# Altium integrated library Altium_WR-TBL_Rising Cage Clamp (rev25a).IntLib: 435 symbols (part 3 of 3)
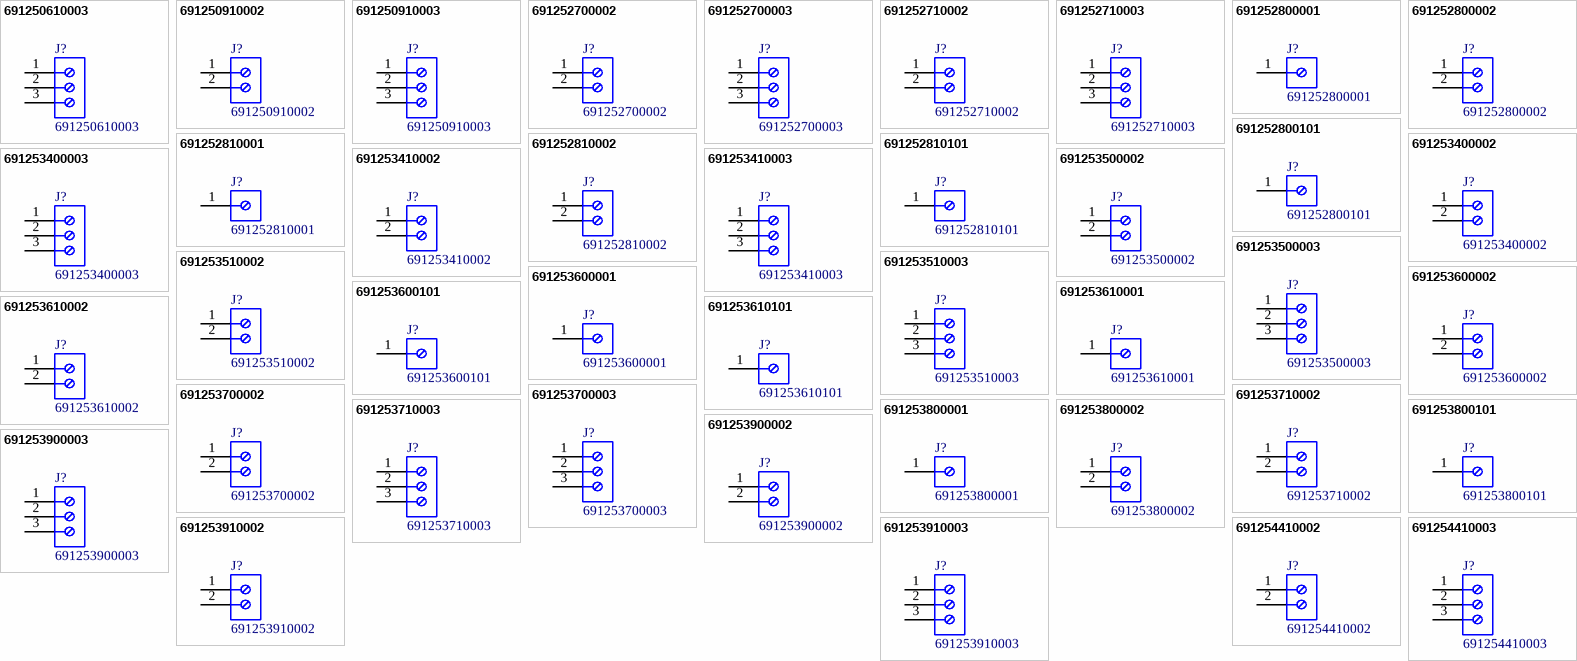
[diagram p12: symbols 691250610003 to 691254410003]

## 691253700002
designator J?
WR-TBL Series 2537 Vertical Entry Modular, THT, pitch 5mm, 02p; Manufacturer: Wurth Elektronik; Modularity: Yes; Rated Current: 16A; System: Rising Cage Clamp; Working Voltage: 300V; Manufacturer Part Number: 691253700002; Category: Terminal Block; Match Code: WR-TBL; ComponentLink1Description: Website Link; ComponentLink1URL: https://www.we-online.com/redexpert/article/691253700002?ad; ComponentLink2Description: Datasheet Link; ComponentLink2URL: https://www.we-online.com/redexpert/spec/691253700002?ad; Mount: Through Hole; Min Operating Temperature: -30°C; Max Operating Temperature: 120°C; Packaging: Box; Application: Rising Cage Clamp; Number of Pins: 2; Number of Rows: 1; Orientation: Vertical; Pitch: 5mm
footprint 691253700002
pins: 1, 2

## 691253700003
designator J?
WR-TBL Series 2537 Vertical Entry Modular, THT, pitch 5mm, 03p; Manufacturer: Wurth Elektronik; Modularity: Yes; Rated Current: 16A; System: Rising Cage Clamp; Working Voltage: 300V; Manufacturer Part Number: 691253700003; Category: Terminal Block; Match Code: WR-TBL; ComponentLink1Description: Website Link; ComponentLink1URL: https://www.we-online.com/redexpert/article/691253700003?ad; ComponentLink2Description: Datasheet Link; ComponentLink2URL: https://www.we-online.com/redexpert/spec/691253700003?ad; Mount: Through Hole; Min Operating Temperature: -30°C; Max Operating Temperature: 120°C; Packaging: Box; Application: Rising Cage Clamp; Number of Pins: 3; Number of Rows: 1; Orientation: Vertical; Pitch: 5mm
footprint 691253700003
pins: 1, 2, 3

## 691253710002
designator J?
WR-TBL Series 2537 Horizontal Entry Modular, THT, pitch 5mm, 02p; Manufacturer: Wurth Elektronik; Modularity: Yes; Rated Current: 16A; System: Rising Cage Clamp; Working Voltage: 300V; Manufacturer Part Number: 691253710002; Category: Terminal Block; Match Code: WR-TBL; ComponentLink1Description: Website Link; ComponentLink1URL: https://www.we-online.com/redexpert/article/691253710002?ad; ComponentLink2Description: Datasheet Link; ComponentLink2URL: https://www.we-online.com/redexpert/spec/691253710002?ad; Mount: Through Hole; Min Operating Temperature: -30°C; Max Operating Temperature: 120°C; Packaging: Box; Application: Rising Cage Clamp; Number of Pins: 2; Number of Rows: 1; Orientation: Horizontal; Pitch: 5mm
footprint 691253710002
pins: 1, 2

## 691253710003
designator J?
WR-TBL Series 2537 Horizontal Entry Modular, THT, pitch 5mm, 03p; Manufacturer: Wurth Elektronik; Modularity: Yes; Rated Current: 16A; System: Rising Cage Clamp; Working Voltage: 300V; Manufacturer Part Number: 691253710003; Category: Terminal Block; Match Code: WR-TBL; ComponentLink1Description: Website Link; ComponentLink1URL: https://www.we-online.com/redexpert/article/691253710003?ad; ComponentLink2Description: Datasheet Link; ComponentLink2URL: https://www.we-online.com/redexpert/spec/691253710003?ad; Mount: Through Hole; Min Operating Temperature: -30°C; Max Operating Temperature: 120°C; Packaging: Box; Application: Rising Cage Clamp; Number of Pins: 3; Number of Rows: 1; Orientation: Horizontal; Pitch: 5mm
footprint 691253710003
pins: 1, 2, 3

## 691253800001
designator J?
WR-TBL Series 2538 Vertical Entry Modular, THT, pitch 10mm, 01p; Manufacturer: Wurth Elektronik; Modularity: Yes; Rated Current: 16A; System: Rising Cage Clamp; Working Voltage: 300V; Manufacturer Part Number: 691253800001; Category: Terminal Block; Match Code: WR-TBL; ComponentLink1Description: Website Link; ComponentLink1URL: https://www.we-online.com/redexpert/article/691253800001?ad; ComponentLink2Description: Datasheet Link; ComponentLink2URL: https://www.we-online.com/redexpert/spec/691253800001?ad; Mount: Through Hole; Min Operating Temperature: -30°C; Max Operating Temperature: 120°C; Packaging: Box; Application: Rising Cage Clamp; Number of Pins: 1; Number of Rows: 1; Orientation: Vertical; Pitch: 10mm
footprint 691253800001
pins: 1

## 691253800002
designator J?
WR-TBL Series 2538 Vertical Entry Modular, THT, pitch 10mm, 02p; Manufacturer: Wurth Elektronik; Modularity: Yes; Rated Current: 16A; System: Rising Cage Clamp; Working Voltage: 300V; Manufacturer Part Number: 691253800002; Category: Terminal Block; Match Code: WR-TBL; ComponentLink1Description: Website Link; ComponentLink1URL: https://www.we-online.com/redexpert/article/691253800002?ad; ComponentLink2Description: Datasheet Link; ComponentLink2URL: https://www.we-online.com/redexpert/spec/691253800002?ad; Mount: Through Hole; Min Operating Temperature: -30°C; Max Operating Temperature: 120°C; Packaging: Box; Application: Rising Cage Clamp; Number of Pins: 2; Number of Rows: 1; Orientation: Vertical; Pitch: 10mm
footprint 691253800002
pins: 1, 2

## 691253800101
designator J?
WR-TBL Series 2538 Vertical Entry Modular, THT, pitch 10mm, 01p; Manufacturer: Wurth Elektronik; Modularity: Yes; Rated Current: 16A; System: Rising Cage Clamp; Working Voltage: 300V; Manufacturer Part Number: 691253800101; Category: Terminal Block; Match Code: WR-TBL; ComponentLink1Description: Website Link; ComponentLink1URL: https://www.we-online.com/redexpert/article/691253800101?ad; ComponentLink2Description: Datasheet Link; ComponentLink2URL: https://www.we-online.com/redexpert/spec/691253800101?ad; Mount: Through Hole; Min Operating Temperature: -30°C; Max Operating Temperature: 120°C; Packaging: Box; Application: Rising Cage Clamp; Number of Pins: 1; Number of Rows: 1; Orientation: Vertical; Pitch: 10mm
footprint 691253800101
pins: 1

## 691253900002
designator J?
WR-TBL Series 2539 Vertical Entry Modular, THT, pitch 7.5mm, 02p; Manufacturer: Wurth Elektronik; Modularity: Yes; Rated Current: 16A; System: Rising Cage Clamp; Working Voltage: 300V; Manufacturer Part Number: 691253900002; Category: Terminal Block; Match Code: WR-TBL; ComponentLink1Description: Website Link; ComponentLink1URL: https://www.we-online.com/redexpert/article/691253900002?ad; ComponentLink2Description: Datasheet Link; ComponentLink2URL: https://www.we-online.com/redexpert/spec/691253900002?ad; Mount: Through Hole; Min Operating Temperature: -30°C; Max Operating Temperature: 120°C; Packaging: Box; Application: Rising Cage Clamp; Number of Pins: 2; Number of Rows: 1; Orientation: Vertical; Pitch: 7.5mm
footprint 691253900002
pins: 1, 2

## 691253900003
designator J?
WR-TBL Series 2539 Vertical Entry Modular, THT, pitch 7.5mm, 03p; Manufacturer: Wurth Elektronik; Modularity: Yes; Rated Current: 16A; System: Rising Cage Clamp; Working Voltage: 300V; Manufacturer Part Number: 691253900003; Category: Terminal Block; Match Code: WR-TBL; ComponentLink1Description: Website Link; ComponentLink1URL: https://www.we-online.com/redexpert/article/691253900003?ad; ComponentLink2Description: Datasheet Link; ComponentLink2URL: https://www.we-online.com/redexpert/spec/691253900003?ad; Mount: Through Hole; Min Operating Temperature: -30°C; Max Operating Temperature: 120°C; Packaging: Box; Application: Rising Cage Clamp; Number of Pins: 3; Number of Rows: 1; Orientation: Vertical; Pitch: 7.5mm
footprint 691253900003
pins: 1, 2, 3

## 691253910002
designator J?
WR-TBL Series 2539 Horizontal Entry Modular, THT, pitch 7.5mm, 02p; Manufacturer: Wurth Elektronik; Modularity: Yes; Rated Current: 16A; System: Rising Cage Clamp; Working Voltage: 300V; Manufacturer Part Number: 691253910002; Category: Terminal Block; Match Code: WR-TBL; ComponentLink1Description: Website Link; ComponentLink1URL: https://www.we-online.com/redexpert/article/691253910002?ad; ComponentLink2Description: Datasheet Link; ComponentLink2URL: https://www.we-online.com/redexpert/spec/691253910002?ad; Mount: Through Hole; Min Operating Temperature: -30°C; Max Operating Temperature: 120°C; Packaging: Box; Application: Rising Cage Clamp; Number of Pins: 2; Number of Rows: 1; Orientation: Horizontal; Pitch: 7.5mm
footprint 691253910002
pins: 1, 2

## 691253910003
designator J?
WR-TBL Series 2539 Horizontal Entry Modular, THT, pitch 7.5mm, 03p; Manufacturer: Wurth Elektronik; Modularity: Yes; Rated Current: 16A; System: Rising Cage Clamp; Working Voltage: 300V; Manufacturer Part Number: 691253910003; Category: Terminal Block; Match Code: WR-TBL; ComponentLink1Description: Website Link; ComponentLink1URL: https://www.we-online.com/redexpert/article/691253910003?ad; ComponentLink2Description: Datasheet Link; ComponentLink2URL: https://www.we-online.com/redexpert/spec/691253910003?ad; Mount: Through Hole; Min Operating Temperature: -30°C; Max Operating Temperature: 120°C; Packaging: Box; Application: Rising Cage Clamp; Number of Pins: 3; Number of Rows: 1; Orientation: Horizontal; Pitch: 7.5mm
footprint 691253910003
pins: 1, 2, 3

## 691254410002
designator J?
WR-TBL Series 2544 Horizontal Entry Dual Pin, THT, pitch 7.62mm, 02p; Manufacturer: Wurth Elektronik; Modularity: Yes; Rated Current: 16A; System: Rising Cage Clamp; Working Voltage: 300V; Manufacturer Part Number: 691254410002; Category: Terminal Block; Match Code: WR-TBL; ComponentLink1Description: Website Link; ComponentLink1URL: https://www.we-online.com/redexpert/article/691254410002?ad; ComponentLink2Description: Datasheet Link; ComponentLink2URL: https://www.we-online.com/redexpert/spec/691254410002?ad; Mount: Through Hole; Min Operating Temperature: -30°C; Max Operating Temperature: 120°C; Packaging: Box; Application: Rising Cage Clamp; Number of Pins: 2; Number of Rows: 1; Orientation: Horizontal; Pitch: 7.62mm
footprint 691254410002
pins: 1, 2

## 691254410003
designator J?
WR-TBL Series 2544 Horizontal Entry Dual Pin, THT, pitch 7.62mm, 03p; Manufacturer: Wurth Elektronik; Modularity: Yes; Rated Current: 16A; System: Rising Cage Clamp; Working Voltage: 300V; Manufacturer Part Number: 691254410003; Category: Terminal Block; Match Code: WR-TBL; ComponentLink1Description: Website Link; ComponentLink1URL: https://www.we-online.com/redexpert/article/691254410003?ad; ComponentLink2Description: Datasheet Link; ComponentLink2URL: https://www.we-online.com/redexpert/spec/691254410003?ad; Mount: Through Hole; Min Operating Temperature: -30°C; Max Operating Temperature: 120°C; Packaging: Box; Application: Rising Cage Clamp; Number of Pins: 3; Number of Rows: 1; Orientation: Horizontal; Pitch: 7.62mm
footprint 691254410003
pins: 1, 2, 3

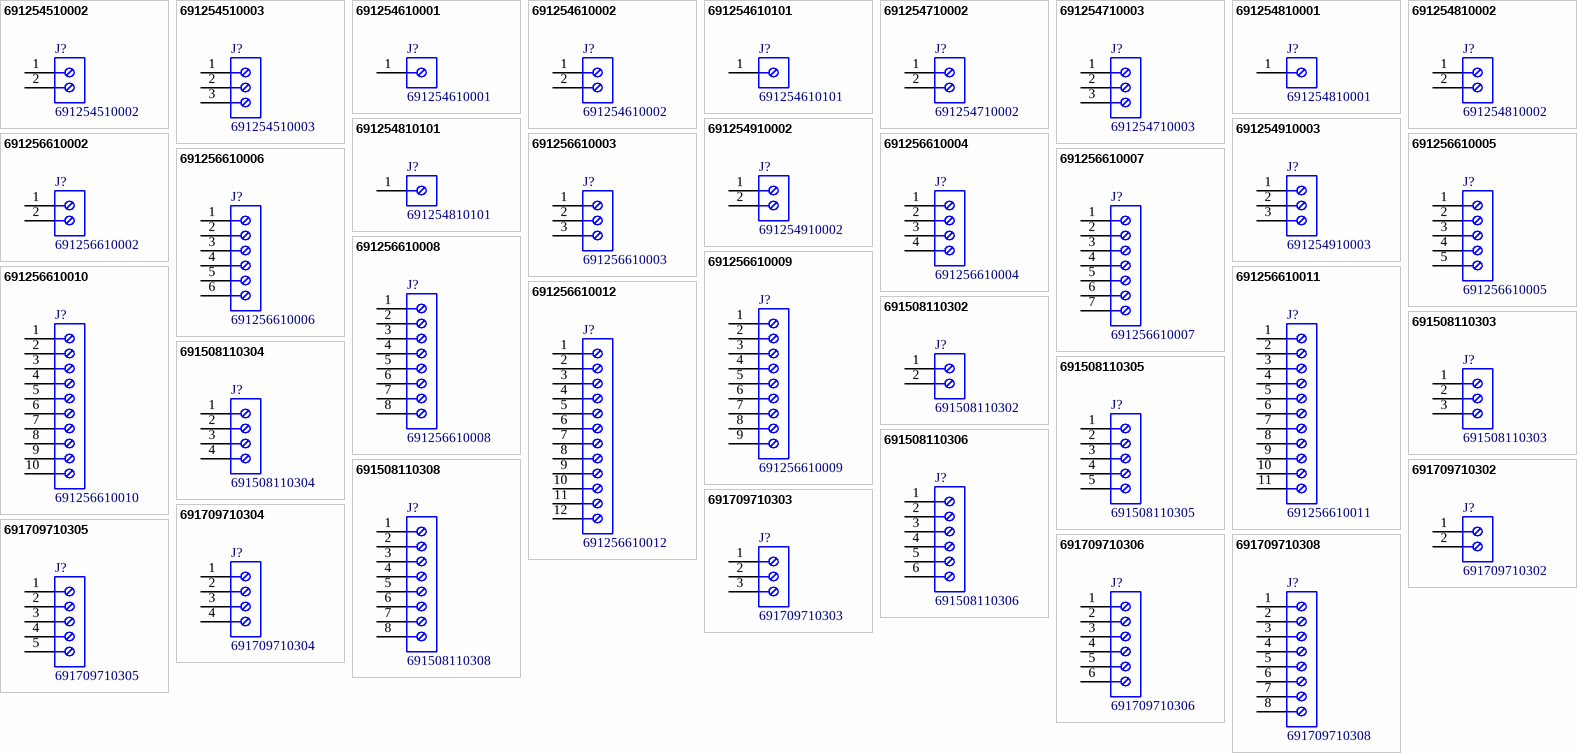
[diagram p10: symbols 691254510002 to 691709710308]

## 691254510002
designator J?
WR-TBL Series 2545 Horizontal Cable Entry, THT, pitch 5.08mm, 02p; Manufacturer: Wurth Elektronik; Modularity: Yes; Rated Current: 16A; System: Rising Cage Clamp; Working Voltage: 300V; Manufacturer Part Number: 691254510002; Category: Terminal Block; Match Code: WR-TBL; ComponentLink1Description: Website Link; ComponentLink1URL: https://www.we-online.com/redexpert/article/691254510002?ad; ComponentLink2Description: Datasheet Link; ComponentLink2URL: https://www.we-online.com/redexpert/spec/691254510002?ad; Mount: Through Hole; Min Operating Temperature: -30°C; Max Operating Temperature: 120°C; Packaging: Box; Application: Rising Cage Clamp; Number of Pins: 2; Number of Rows: 1; Orientation: Horizontal; Pitch: 5.08mm
footprint 691254510002
pins: 1, 2

## 691254510003
designator J?
WR-TBL Series 2545 Horizontal Cable Entry, THT, pitch 5.08mm, 03p; Manufacturer: Wurth Elektronik; Modularity: Yes; Rated Current: 16A; System: Rising Cage Clamp; Working Voltage: 300V; Manufacturer Part Number: 691254510003; Category: Terminal Block; Match Code: WR-TBL; ComponentLink1Description: Website Link; ComponentLink1URL: https://www.we-online.com/redexpert/article/691254510003?ad; ComponentLink2Description: Datasheet Link; ComponentLink2URL: https://www.we-online.com/redexpert/spec/691254510003?ad; Mount: Through Hole; Min Operating Temperature: -30°C; Max Operating Temperature: 120°C; Packaging: Box; Application: Rising Cage Clamp; Number of Pins: 3; Number of Rows: 1; Orientation: Horizontal; Pitch: 5.08mm
footprint 691254510003
pins: 1, 2, 3

## 691254610001
designator J?
WR-TBL Series 2546 Horizontal Cable Entry, THT, pitch 10.16mm, 01p; Manufacturer: Wurth Elektronik; Modularity: Yes; Rated Current: 16A; System: Rising Cage Clamp; Working Voltage: 300V; Manufacturer Part Number: 691254610001; Category: Terminal Block; Match Code: WR-TBL; ComponentLink1Description: Website Link; ComponentLink1URL: https://www.we-online.com/redexpert/article/691254610001?ad; ComponentLink2Description: Datasheet Link; ComponentLink2URL: https://www.we-online.com/redexpert/spec/691254610001?ad; Mount: Through Hole; Min Operating Temperature: -30°C; Max Operating Temperature: 120°C; Packaging: Box; Application: Rising Cage Clamp; Number of Pins: 1; Number of Rows: 1; Orientation: Horizontal; Pitch: 10.16mm
footprint 691254610001
pins: 1

## 691254610002
designator J?
WR-TBL Series 2546 Horizontal Cable Entry, THT, pitch 10.16mm, 02p; Manufacturer: Wurth Elektronik; Modularity: Yes; Rated Current: 16A; System: Rising Cage Clamp; Working Voltage: 300V; Manufacturer Part Number: 691254610002; Category: Terminal Block; Match Code: WR-TBL; ComponentLink1Description: Website Link; ComponentLink1URL: https://www.we-online.com/redexpert/article/691254610002?ad; ComponentLink2Description: Datasheet Link; ComponentLink2URL: https://www.we-online.com/redexpert/spec/691254610002?ad; Mount: Through Hole; Min Operating Temperature: -30°C; Max Operating Temperature: 120°C; Packaging: Box; Application: Rising Cage Clamp; Number of Pins: 2; Number of Rows: 1; Orientation: Horizontal; Pitch: 10.16mm
footprint 691254610002
pins: 1, 2

## 691254610101
designator J?
WR-TBL Series 2546 Horizontal Cable Entry, THT, pitch 10.16mm, 01p; Manufacturer: Wurth Elektronik; Modularity: Yes; Rated Current: 16A; System: Rising Cage Clamp; Working Voltage: 300V; Manufacturer Part Number: 691254610101; Category: Terminal Block; Match Code: WR-TBL; ComponentLink1Description: Website Link; ComponentLink1URL: https://www.we-online.com/redexpert/article/691254610101?ad; ComponentLink2Description: Datasheet Link; ComponentLink2URL: https://www.we-online.com/redexpert/spec/691254610101?ad; Mount: Through Hole; Min Operating Temperature: -30°C; Max Operating Temperature: 120°C; Packaging: Box; Application: Rising Cage Clamp; Number of Pins: 1; Number of Rows: 1; Orientation: Horizontal; Pitch: 10.16mm
footprint 691254610101
pins: 1

## 691254710002
designator J?
WR-TBL Series 2547 Horizontal Cable Entry, THT, pitch 5mm, 02p; Manufacturer: Wurth Elektronik; Modularity: Yes; Rated Current: 16A; System: Rising Cage Clamp; Working Voltage: 300V; Manufacturer Part Number: 691254710002; Category: Terminal Block; Match Code: WR-TBL; ComponentLink1Description: Website Link; ComponentLink1URL: https://www.we-online.com/redexpert/article/691254710002?ad; ComponentLink2Description: Datasheet Link; ComponentLink2URL: https://www.we-online.com/redexpert/spec/691254710002?ad; Mount: Through Hole; Min Operating Temperature: -30°C; Max Operating Temperature: 120°C; Packaging: Box; Application: Rising Cage Clamp; Number of Pins: 2; Number of Rows: 1; Orientation: Horizontal; Pitch: 5mm
footprint 691254710002
pins: 1, 2

## 691254710003
designator J?
WR-TBL Series 2547 Horizontal Cable Entry, THT, pitch 5mm, 03p; Manufacturer: Wurth Elektronik; Modularity: Yes; Rated Current: 16A; System: Rising Cage Clamp; Working Voltage: 300V; Manufacturer Part Number: 691254710003; Category: Terminal Block; Match Code: WR-TBL; ComponentLink1Description: Website Link; ComponentLink1URL: https://www.we-online.com/redexpert/article/691254710003?ad; ComponentLink2Description: Datasheet Link; ComponentLink2URL: https://www.we-online.com/redexpert/spec/691254710003?ad; Mount: Through Hole; Min Operating Temperature: -30°C; Max Operating Temperature: 120°C; Packaging: Box; Application: Rising Cage Clamp; Number of Pins: 3; Number of Rows: 1; Orientation: Horizontal; Pitch: 5mm
footprint 691254710003
pins: 1, 2, 3

## 691254810001
designator J?
WR-TBL Series 2548 Horizontal Cable Entry, THT, pitch 10mm, 01p; Manufacturer: Wurth Elektronik; Modularity: Yes; Rated Current: 16A; System: Rising Cage Clamp; Working Voltage: 300V; Manufacturer Part Number: 691254810001; Category: Terminal Block; Match Code: WR-TBL; ComponentLink1Description: Website Link; ComponentLink1URL: https://www.we-online.com/redexpert/article/691254810001?ad; ComponentLink2Description: Datasheet Link; ComponentLink2URL: https://www.we-online.com/redexpert/spec/691254810001?ad; Mount: Through Hole; Min Operating Temperature: -30°C; Max Operating Temperature: 120°C; Packaging: Box; Application: Rising Cage Clamp; Number of Pins: 1; Number of Rows: 1; Orientation: Horizontal; Pitch: 10mm
footprint 691254810001
pins: 1

## 691254810002
designator J?
WR-TBL Series 2548 Horizontal Cable Entry, THT, pitch 10mm, 02p; Manufacturer: Wurth Elektronik; Modularity: Yes; Rated Current: 16A; System: Rising Cage Clamp; Working Voltage: 300V; Manufacturer Part Number: 691254810002; Category: Terminal Block; Match Code: WR-TBL; ComponentLink1Description: Website Link; ComponentLink1URL: https://www.we-online.com/redexpert/article/691254810002?ad; ComponentLink2Description: Datasheet Link; ComponentLink2URL: https://www.we-online.com/redexpert/spec/691254810002?ad; Mount: Through Hole; Min Operating Temperature: -30°C; Max Operating Temperature: 120°C; Packaging: Box; Application: Rising Cage Clamp; Number of Pins: 2; Number of Rows: 1; Orientation: Horizontal; Pitch: 10mm
footprint 691254810002
pins: 1, 2

## 691254810101
designator J?
WR-TBL Series 2548 Horizontal Cable Entry, THT, pitch 10mm, 01p; Manufacturer: Wurth Elektronik; Modularity: Yes; Rated Current: 16A; System: Rising Cage Clamp; Working Voltage: 300V; Manufacturer Part Number: 691254810101; Category: Terminal Block; Match Code: WR-TBL; ComponentLink1Description: Website Link; ComponentLink1URL: https://www.we-online.com/redexpert/article/691254810101?ad; ComponentLink2Description: Datasheet Link; ComponentLink2URL: https://www.we-online.com/redexpert/spec/691254810101?ad; Mount: Through Hole; Min Operating Temperature: -30°C; Max Operating Temperature: 120°C; Packaging: Box; Application: Rising Cage Clamp; Number of Pins: 1; Number of Rows: 1; Orientation: Horizontal; Pitch: 10mm
footprint 691254810101
pins: 1

## 691254910002
designator J?
WR-TBL Series 2549 Horizontal Cable Entry, THT, pitch 7.5mm, 02p; Manufacturer: Wurth Elektronik; Modularity: Yes; Rated Current: 16A; System: Rising Cage Clamp; Working Voltage: 300V; Manufacturer Part Number: 691254910002; Category: Terminal Block; Match Code: WR-TBL; ComponentLink1Description: Website Link; ComponentLink1URL: https://www.we-online.com/redexpert/article/691254910002?ad; ComponentLink2Description: Datasheet Link; ComponentLink2URL: https://www.we-online.com/redexpert/spec/691254910002?ad; Mount: Through Hole; Min Operating Temperature: -30°C; Max Operating Temperature: 120°C; Packaging: Box; Application: Rising Cage Clamp; Number of Pins: 2; Number of Rows: 1; Orientation: Horizontal; Pitch: 7.5mm
footprint 691254910002
pins: 1, 2

## 691254910003
designator J?
WR-TBL Series 2549 Horizontal Cable Entry, THT, pitch 7.5mm, 03p; Manufacturer: Wurth Elektronik; Modularity: Yes; Rated Current: 16A; System: Rising Cage Clamp; Working Voltage: 300V; Manufacturer Part Number: 691254910003; Category: Terminal Block; Match Code: WR-TBL; ComponentLink1Description: Website Link; ComponentLink1URL: https://www.we-online.com/redexpert/article/691254910003?ad; ComponentLink2Description: Datasheet Link; ComponentLink2URL: https://www.we-online.com/redexpert/spec/691254910003?ad; Mount: Through Hole; Min Operating Temperature: -30°C; Max Operating Temperature: 120°C; Packaging: Box; Application: Rising Cage Clamp; Number of Pins: 3; Number of Rows: 1; Orientation: Horizontal; Pitch: 7.5mm
footprint 691254910003
pins: 1, 2, 3

## 691256610002
designator J?
WR-TBL Series 2566 Horizontal Entry, THT, pitch 10.16mm, 02p; Manufacturer: Wurth Elektronik; Modularity: No; Rated Current: 40A; System: Rising Cage Clamp; Working Voltage: 300V; Manufacturer Part Number: 691256610002; Category: Terminal Block; Match Code: WR-TBL; ComponentLink1Description: Website Link; ComponentLink1URL: https://www.we-online.com/redexpert/article/691256610002?ad; ComponentLink2Description: Datasheet Link; ComponentLink2URL: https://www.we-online.com/redexpert/spec/691256610002?ad; Mount: Through Hole; Min Operating Temperature: -30°C; Max Operating Temperature: 120°C; Packaging: Box; Application: Rising Cage Clamp; Number of Pins: 2; Number of Rows: 1; Orientation: Horizontal; Pitch: 10.16mm
footprint 691256610002
pins: 1, 2

## 691256610003
designator J?
WR-TBL Series 2566 Horizontal Entry, THT, pitch 10.16mm, 03p; Manufacturer: Wurth Elektronik; Modularity: No; Rated Current: 40A; System: Rising Cage Clamp; Working Voltage: 300V; Manufacturer Part Number: 691256610003; Category: Terminal Block; Match Code: WR-TBL; ComponentLink1Description: Website Link; ComponentLink1URL: https://www.we-online.com/redexpert/article/691256610003?ad; ComponentLink2Description: Datasheet Link; ComponentLink2URL: https://www.we-online.com/redexpert/spec/691256610003?ad; Mount: Through Hole; Min Operating Temperature: -30°C; Max Operating Temperature: 120°C; Packaging: Box; Application: Rising Cage Clamp; Number of Pins: 3; Number of Rows: 1; Orientation: Horizontal; Pitch: 10.16mm
footprint 691256610003
pins: 1, 2, 3

## 691256610004
designator J?
WR-TBL Series 2566 Horizontal Entry, THT, pitch 10.16mm, 04p; Manufacturer: Wurth Elektronik; Modularity: No; Rated Current: 40A; System: Rising Cage Clamp; Working Voltage: 300V; Manufacturer Part Number: 691256610004; Category: Terminal Block; Match Code: WR-TBL; ComponentLink1Description: Website Link; ComponentLink1URL: https://www.we-online.com/redexpert/article/691256610004?ad; ComponentLink2Description: Datasheet Link; ComponentLink2URL: https://www.we-online.com/redexpert/spec/691256610004?ad; Mount: Through Hole; Min Operating Temperature: -30°C; Max Operating Temperature: 120°C; Packaging: Box; Application: Rising Cage Clamp; Number of Pins: 4; Number of Rows: 1; Orientation: Horizontal; Pitch: 10.16mm
footprint 691256610004
pins: 1, 2, 3, 4

## 691256610005
designator J?
WR-TBL Series 2566 Horizontal Entry, THT, pitch 10.16mm, 05p; Manufacturer: Wurth Elektronik; Modularity: No; Rated Current: 40A; System: Rising Cage Clamp; Working Voltage: 300V; Manufacturer Part Number: 691256610005; Category: Terminal Block; Match Code: WR-TBL; ComponentLink1Description: Website Link; ComponentLink1URL: https://www.we-online.com/redexpert/article/691256610005?ad; ComponentLink2Description: Datasheet Link; ComponentLink2URL: https://www.we-online.com/redexpert/spec/691256610005?ad; Mount: Through Hole; Min Operating Temperature: -30°C; Max Operating Temperature: 120°C; Packaging: Box; Application: Rising Cage Clamp; Number of Pins: 5; Number of Rows: 1; Orientation: Horizontal; Pitch: 10.16mm
footprint 691256610005
pins: 1, 2, 3, 4, 5

## 691256610006
designator J?
WR-TBL Series 2566 Horizontal Entry, THT, pitch 10.16mm, 06p; Manufacturer: Wurth Elektronik; Modularity: No; Rated Current: 40A; System: Rising Cage Clamp; Working Voltage: 300V; Manufacturer Part Number: 691256610006; Category: Terminal Block; Match Code: WR-TBL; ComponentLink1Description: Website Link; ComponentLink1URL: https://www.we-online.com/redexpert/article/691256610006?ad; ComponentLink2Description: Datasheet Link; ComponentLink2URL: https://www.we-online.com/redexpert/spec/691256610006?ad; Mount: Through Hole; Min Operating Temperature: -30°C; Max Operating Temperature: 120°C; Packaging: Box; Application: Rising Cage Clamp; Number of Pins: 6; Number of Rows: 1; Orientation: Horizontal; Pitch: 10.16mm
footprint 691256610006
pins: 1, 2, 3, 4, 5, 6

## 691256610007
designator J?
WR-TBL Series 2566 Horizontal Entry, THT, pitch 10.16mm, 07p; Manufacturer: Wurth Elektronik; Modularity: No; Rated Current: 40A; System: Rising Cage Clamp; Working Voltage: 300V; Manufacturer Part Number: 691256610007; Category: Terminal Block; Match Code: WR-TBL; ComponentLink1Description: Website Link; ComponentLink1URL: https://www.we-online.com/redexpert/article/691256610007?ad; ComponentLink2Description: Datasheet Link; ComponentLink2URL: https://www.we-online.com/redexpert/spec/691256610007?ad; Mount: Through Hole; Min Operating Temperature: -30°C; Max Operating Temperature: 120°C; Packaging: Box; Application: Rising Cage Clamp; Number of Pins: 7; Number of Rows: 1; Orientation: Horizontal; Pitch: 10.16mm
footprint 691256610007
pins: 1, 2, 3, 4, 5, 6, 7

## 691256610008
designator J?
WR-TBL Series 2566 Horizontal Entry, THT, pitch 10.16mm, 08p; Manufacturer: Wurth Elektronik; Modularity: No; Rated Current: 40A; System: Rising Cage Clamp; Working Voltage: 300V; Manufacturer Part Number: 691256610008; Category: Terminal Block; Match Code: WR-TBL; ComponentLink1Description: Website Link; ComponentLink1URL: https://www.we-online.com/redexpert/article/691256610008?ad; ComponentLink2Description: Datasheet Link; ComponentLink2URL: https://www.we-online.com/redexpert/spec/691256610008?ad; Mount: Through Hole; Min Operating Temperature: -30°C; Max Operating Temperature: 120°C; Packaging: Box; Application: Rising Cage Clamp; Number of Pins: 8; Number of Rows: 1; Orientation: Horizontal; Pitch: 10.16mm
footprint 691256610008
pins: 1, 2, 3, 4, 5, 6, 7, 8

## 691256610009
designator J?
WR-TBL Series 2566 Horizontal Entry, THT, pitch 10.16mm, 09p; Manufacturer: Wurth Elektronik; Modularity: No; Rated Current: 40A; System: Rising Cage Clamp; Working Voltage: 300V; Manufacturer Part Number: 691256610009; Category: Terminal Block; Match Code: WR-TBL; ComponentLink1Description: Website Link; ComponentLink1URL: https://www.we-online.com/redexpert/article/691256610009?ad; ComponentLink2Description: Datasheet Link; ComponentLink2URL: https://www.we-online.com/redexpert/spec/691256610009?ad; Mount: Through Hole; Min Operating Temperature: -30°C; Max Operating Temperature: 120°C; Packaging: Box; Application: Rising Cage Clamp; Number of Pins: 9; Number of Rows: 1; Orientation: Horizontal; Pitch: 10.16mm
footprint 691256610009
pins: 1, 2, 3, 4, 5, 6, 7, 8, 9

## 691256610010
designator J?
WR-TBL Series 2566 Horizontal Entry, THT, pitch 10.16mm, 10p; Manufacturer: Wurth Elektronik; Modularity: No; Rated Current: 40A; System: Rising Cage Clamp; Working Voltage: 300V; Manufacturer Part Number: 691256610010; Category: Terminal Block; Match Code: WR-TBL; ComponentLink1Description: Website Link; ComponentLink1URL: https://www.we-online.com/redexpert/article/691256610010?ad; ComponentLink2Description: Datasheet Link; ComponentLink2URL: https://www.we-online.com/redexpert/spec/691256610010?ad; Mount: Through Hole; Min Operating Temperature: -30°C; Max Operating Temperature: 120°C; Packaging: Box; Application: Rising Cage Clamp; Number of Pins: 10; Number of Rows: 1; Orientation: Horizontal; Pitch: 10.16mm
footprint 691256610010
pins: 1, 2, 3, 4, 5, 6, 7, 8, 9, 10

## 691256610011
designator J?
WR-TBL Series 2566 Horizontal Entry, THT, pitch 10.16mm, 11p; Manufacturer: Wurth Elektronik; Modularity: No; Rated Current: 40A; System: Rising Cage Clamp; Working Voltage: 300V; Manufacturer Part Number: 691256610011; Category: Terminal Block; Match Code: WR-TBL; ComponentLink1Description: Website Link; ComponentLink1URL: https://www.we-online.com/redexpert/article/691256610011?ad; ComponentLink2Description: Datasheet Link; ComponentLink2URL: https://www.we-online.com/redexpert/spec/691256610011?ad; Mount: Through Hole; Min Operating Temperature: -30°C; Max Operating Temperature: 120°C; Packaging: Box; Application: Rising Cage Clamp; Number of Pins: 11; Number of Rows: 1; Orientation: Horizontal; Pitch: 10.16mm
footprint 691256610011
pins: 1, 2, 3, 4, 5, 6, 7, 8, 9, 10, 11

## 691256610012
designator J?
WR-TBL Series 2566 Horizontal Entry, THT, pitch 10.16mm, 12p; Manufacturer: Wurth Elektronik; Modularity: No; Rated Current: 40A; System: Rising Cage Clamp; Working Voltage: 300V; Manufacturer Part Number: 691256610012; Category: Terminal Block; Match Code: WR-TBL; ComponentLink1Description: Website Link; ComponentLink1URL: https://www.we-online.com/redexpert/article/691256610012?ad; ComponentLink2Description: Datasheet Link; ComponentLink2URL: https://www.we-online.com/redexpert/spec/691256610012?ad; Mount: Through Hole; Min Operating Temperature: -30°C; Max Operating Temperature: 120°C; Packaging: Box; Application: Rising Cage Clamp; Number of Pins: 12; Number of Rows: 1; Orientation: Horizontal; Pitch: 10.16mm
footprint 691256610012
pins: 1, 2, 3, 4, 5, 6, 7, 8, 9, 10, 11, 12

## 691508110302
designator J?
WR-TBL Series 5081 Horizontal Entry, SMT, pitch 3.5mm, 02p; Manufacturer: Wurth Elektronik; Modularity: No; Rated Current: 10A; System: Rising Cage Clamp; Working Voltage: 300V; Manufacturer Part Number: 691508110302; Category: Terminal Block; Match Code: WR-TBL; ComponentLink1Description: Website Link; ComponentLink1URL: https://www.we-online.com/redexpert/article/691508110302?ad; ComponentLink2Description: Datasheet Link; ComponentLink2URL: https://www.we-online.com/redexpert/spec/691508110302?ad; Mount: Surface Mount; Min Operating Temperature: -40°C; Max Operating Temperature: 130°C; Packaging: Tape and Reel; Application: Rising Cage Clamp; Number of Pins: 2; Number of Rows: 1; Orientation: Horizontal; Pitch: 3.5mm
footprint 691508110302
pins: 1, 2

## 691508110303
designator J?
WR-TBL Series 5081 Horizontal Entry, SMT, pitch 3.5mm, 03p; Manufacturer: Wurth Elektronik; Modularity: No; Rated Current: 10A; System: Rising Cage Clamp; Working Voltage: 300V; Manufacturer Part Number: 691508110303; Category: Terminal Block; Match Code: WR-TBL; ComponentLink1Description: Website Link; ComponentLink1URL: https://www.we-online.com/redexpert/article/691508110303?ad; ComponentLink2Description: Datasheet Link; ComponentLink2URL: https://www.we-online.com/redexpert/spec/691508110303?ad; Mount: Surface Mount; Min Operating Temperature: -40°C; Max Operating Temperature: 130°C; Packaging: Tape and Reel; Application: Rising Cage Clamp; Number of Pins: 3; Number of Rows: 1; Orientation: Horizontal; Pitch: 3.5mm
footprint 691508110303
pins: 1, 2, 3

## 691508110304
designator J?
WR-TBL Series 5081 Horizontal Entry, SMT, pitch 3.5mm, 04p; Manufacturer: Wurth Elektronik; Modularity: No; Rated Current: 10A; System: Rising Cage Clamp; Working Voltage: 300V; Manufacturer Part Number: 691508110304; Category: Terminal Block; Match Code: WR-TBL; ComponentLink1Description: Website Link; ComponentLink1URL: https://www.we-online.com/redexpert/article/691508110304?ad; ComponentLink2Description: Datasheet Link; ComponentLink2URL: https://www.we-online.com/redexpert/spec/691508110304?ad; Mount: Surface Mount; Min Operating Temperature: -40°C; Max Operating Temperature: 130°C; Packaging: Tape and Reel; Application: Rising Cage Clamp; Number of Pins: 4; Number of Rows: 1; Orientation: Horizontal; Pitch: 3.5mm
footprint 691508110304
pins: 1, 2, 3, 4

## 691508110305
designator J?
WR-TBL Series 5081 Horizontal Entry, SMT, pitch 3.5mm, 05p; Manufacturer: Wurth Elektronik; Modularity: No; Rated Current: 10A; System: Rising Cage Clamp; Working Voltage: 300V; Manufacturer Part Number: 691508110305; Category: Terminal Block; Match Code: WR-TBL; ComponentLink1Description: Website Link; ComponentLink1URL: https://www.we-online.com/redexpert/article/691508110305?ad; ComponentLink2Description: Datasheet Link; ComponentLink2URL: https://www.we-online.com/redexpert/spec/691508110305?ad; Mount: Surface Mount; Min Operating Temperature: -40°C; Max Operating Temperature: 130°C; Packaging: Tape and Reel; Application: Rising Cage Clamp; Number of Pins: 5; Number of Rows: 1; Orientation: Horizontal; Pitch: 3.5mm
footprint 691508110305
pins: 1, 2, 3, 4, 5

## 691508110306
designator J?
WR-TBL Series 5081 Horizontal Entry, SMT, pitch 3.5mm, 06p; Manufacturer: Wurth Elektronik; Modularity: No; Rated Current: 10A; System: Rising Cage Clamp; Working Voltage: 300V; Manufacturer Part Number: 691508110306; Category: Terminal Block; Match Code: WR-TBL; ComponentLink1Description: Website Link; ComponentLink1URL: https://www.we-online.com/redexpert/article/691508110306?ad; ComponentLink2Description: Datasheet Link; ComponentLink2URL: https://www.we-online.com/redexpert/spec/691508110306?ad; Mount: Surface Mount; Min Operating Temperature: -40°C; Max Operating Temperature: 130°C; Packaging: Tape and Reel; Application: Rising Cage Clamp; Number of Pins: 6; Number of Rows: 1; Orientation: Horizontal; Pitch: 3.5mm
footprint 691508110306
pins: 1, 2, 3, 4, 5, 6

## 691508110308
designator J?
WR-TBL Series 5081 Horizontal Entry, SMT, pitch 3.5mm, 08p; Manufacturer: Wurth Elektronik; Modularity: No; Rated Current: 10A; System: Rising Cage Clamp; Working Voltage: 300V; Manufacturer Part Number: 691508110308; Category: Terminal Block; Match Code: WR-TBL; ComponentLink1Description: Website Link; ComponentLink1URL: https://www.we-online.com/redexpert/article/691508110308?ad; ComponentLink2Description: Datasheet Link; ComponentLink2URL: https://www.we-online.com/redexpert/spec/691508110308?ad; Mount: Surface Mount; Min Operating Temperature: -40°C; Max Operating Temperature: 130°C; Packaging: Tape and Reel; Application: Rising Cage Clamp; Number of Pins: 8; Number of Rows: 1; Orientation: Horizontal; Pitch: 3.5mm
footprint 691508110308
pins: 1, 2, 3, 4, 5, 6, 7, 8

## 691709710302
designator J?
WR-TBL Series 7097 Horizontal Entry, SMT, pitch 5mm, 02p; Manufacturer: Wurth Elektronik; Modularity: No; Rated Current: 6A; System: Rising Cage Clamp; Working Voltage: 300V; Manufacturer Part Number: 691709710302; Category: Terminal Block; Match Code: WR-TBL; ComponentLink1Description: Website Link; ComponentLink1URL: https://www.we-online.com/redexpert/article/691709710302?ad; ComponentLink2Description: Datasheet Link; ComponentLink2URL: https://www.we-online.com/redexpert/spec/691709710302?ad; Mount: Surface Mount; Min Operating Temperature: -40°C; Max Operating Temperature: 130°C; Packaging: Tape and Reel; Application: Rising Cage Clamp; Number of Pins: 2; Number of Rows: 1; Orientation: Horizontal; Pitch: 5mm
footprint 691709710302
pins: 1, 2

## 691709710303
designator J?
WR-TBL Series 7097 Horizontal Entry, SMT, pitch 5mm, 03p; Manufacturer: Wurth Elektronik; Modularity: No; Rated Current: 6A; System: Rising Cage Clamp; Working Voltage: 300V; Manufacturer Part Number: 691709710303; Category: Terminal Block; Match Code: WR-TBL; ComponentLink1Description: Website Link; ComponentLink1URL: https://www.we-online.com/redexpert/article/691709710303?ad; ComponentLink2Description: Datasheet Link; ComponentLink2URL: https://www.we-online.com/redexpert/spec/691709710303?ad; Mount: Surface Mount; Min Operating Temperature: -40°C; Max Operating Temperature: 130°C; Packaging: Tape and Reel; Application: Rising Cage Clamp; Number of Pins: 3; Number of Rows: 1; Orientation: Horizontal; Pitch: 5mm
footprint 691709710303
pins: 1, 2, 3

## 691709710304
designator J?
WR-TBL Series 7097 Horizontal Entry, SMT, pitch 5mm, 04p; Manufacturer: Wurth Elektronik; Modularity: No; Rated Current: 6A; System: Rising Cage Clamp; Working Voltage: 300V; Manufacturer Part Number: 691709710304; Category: Terminal Block; Match Code: WR-TBL; ComponentLink1Description: Website Link; ComponentLink1URL: https://www.we-online.com/redexpert/article/691709710304?ad; ComponentLink2Description: Datasheet Link; ComponentLink2URL: https://www.we-online.com/redexpert/spec/691709710304?ad; Mount: Surface Mount; Min Operating Temperature: -40°C; Max Operating Temperature: 130°C; Packaging: Tape and Reel; Application: Rising Cage Clamp; Number of Pins: 4; Number of Rows: 1; Orientation: Horizontal; Pitch: 5mm
footprint 691709710304
pins: 1, 2, 3, 4

## 691709710305
designator J?
WR-TBL Series 7097 Horizontal Entry, SMT, pitch 5mm, 05p; Manufacturer: Wurth Elektronik; Modularity: No; Rated Current: 6A; System: Rising Cage Clamp; Working Voltage: 300V; Manufacturer Part Number: 691709710305; Category: Terminal Block; Match Code: WR-TBL; ComponentLink1Description: Website Link; ComponentLink1URL: https://www.we-online.com/redexpert/article/691709710305?ad; ComponentLink2Description: Datasheet Link; ComponentLink2URL: https://www.we-online.com/redexpert/spec/691709710305?ad; Mount: Surface Mount; Min Operating Temperature: -40°C; Max Operating Temperature: 130°C; Packaging: Tape and Reel; Application: Rising Cage Clamp; Number of Pins: 5; Number of Rows: 1; Orientation: Horizontal; Pitch: 5mm
footprint 691709710305
pins: 1, 2, 3, 4, 5

## 691709710306
designator J?
WR-TBL Series 7097 Horizontal Entry, SMT, pitch 5mm, 06p; Manufacturer: Wurth Elektronik; Modularity: No; Rated Current: 6A; System: Rising Cage Clamp; Working Voltage: 300V; Manufacturer Part Number: 691709710306; Category: Terminal Block; Match Code: WR-TBL; ComponentLink1Description: Website Link; ComponentLink1URL: https://www.we-online.com/redexpert/article/691709710306?ad; ComponentLink2Description: Datasheet Link; ComponentLink2URL: https://www.we-online.com/redexpert/spec/691709710306?ad; Mount: Surface Mount; Min Operating Temperature: -40°C; Max Operating Temperature: 130°C; Packaging: Tape and Reel; Application: Rising Cage Clamp; Number of Pins: 6; Number of Rows: 1; Orientation: Horizontal; Pitch: 5mm
footprint 691709710306
pins: 1, 2, 3, 4, 5, 6

## 691709710308
designator J?
WR-TBL Series 7097 Horizontal Entry, SMT, pitch 5mm, 08p; Manufacturer: Wurth Elektronik; Modularity: No; Rated Current: 6A; System: Rising Cage Clamp; Working Voltage: 300V; Manufacturer Part Number: 691709710308; Category: Terminal Block; Match Code: WR-TBL; ComponentLink1Description: Website Link; ComponentLink1URL: https://www.we-online.com/redexpert/article/691709710308?ad; ComponentLink2Description: Datasheet Link; ComponentLink2URL: https://www.we-online.com/redexpert/spec/691709710308?ad; Mount: Surface Mount; Min Operating Temperature: -40°C; Max Operating Temperature: 130°C; Packaging: Tape and Reel; Application: Rising Cage Clamp; Number of Pins: 8; Number of Rows: 1; Orientation: Horizontal; Pitch: 5mm
footprint 691709710308
pins: 1, 2, 3, 4, 5, 6, 7, 8